# Altium footprint library BOARDS.PcbLib: 27 footprints (part 1 of 2)
Each footprint in its own frame and in the unit in brackets; x right, y up, seen from the top. Pads: shape width x height; smd on the part's side, far side on the other; paste and mask are expansions set on the pad; w line width, h text height; cw(c..) or ccw(c..) is an arc to the next point about the centre after c.
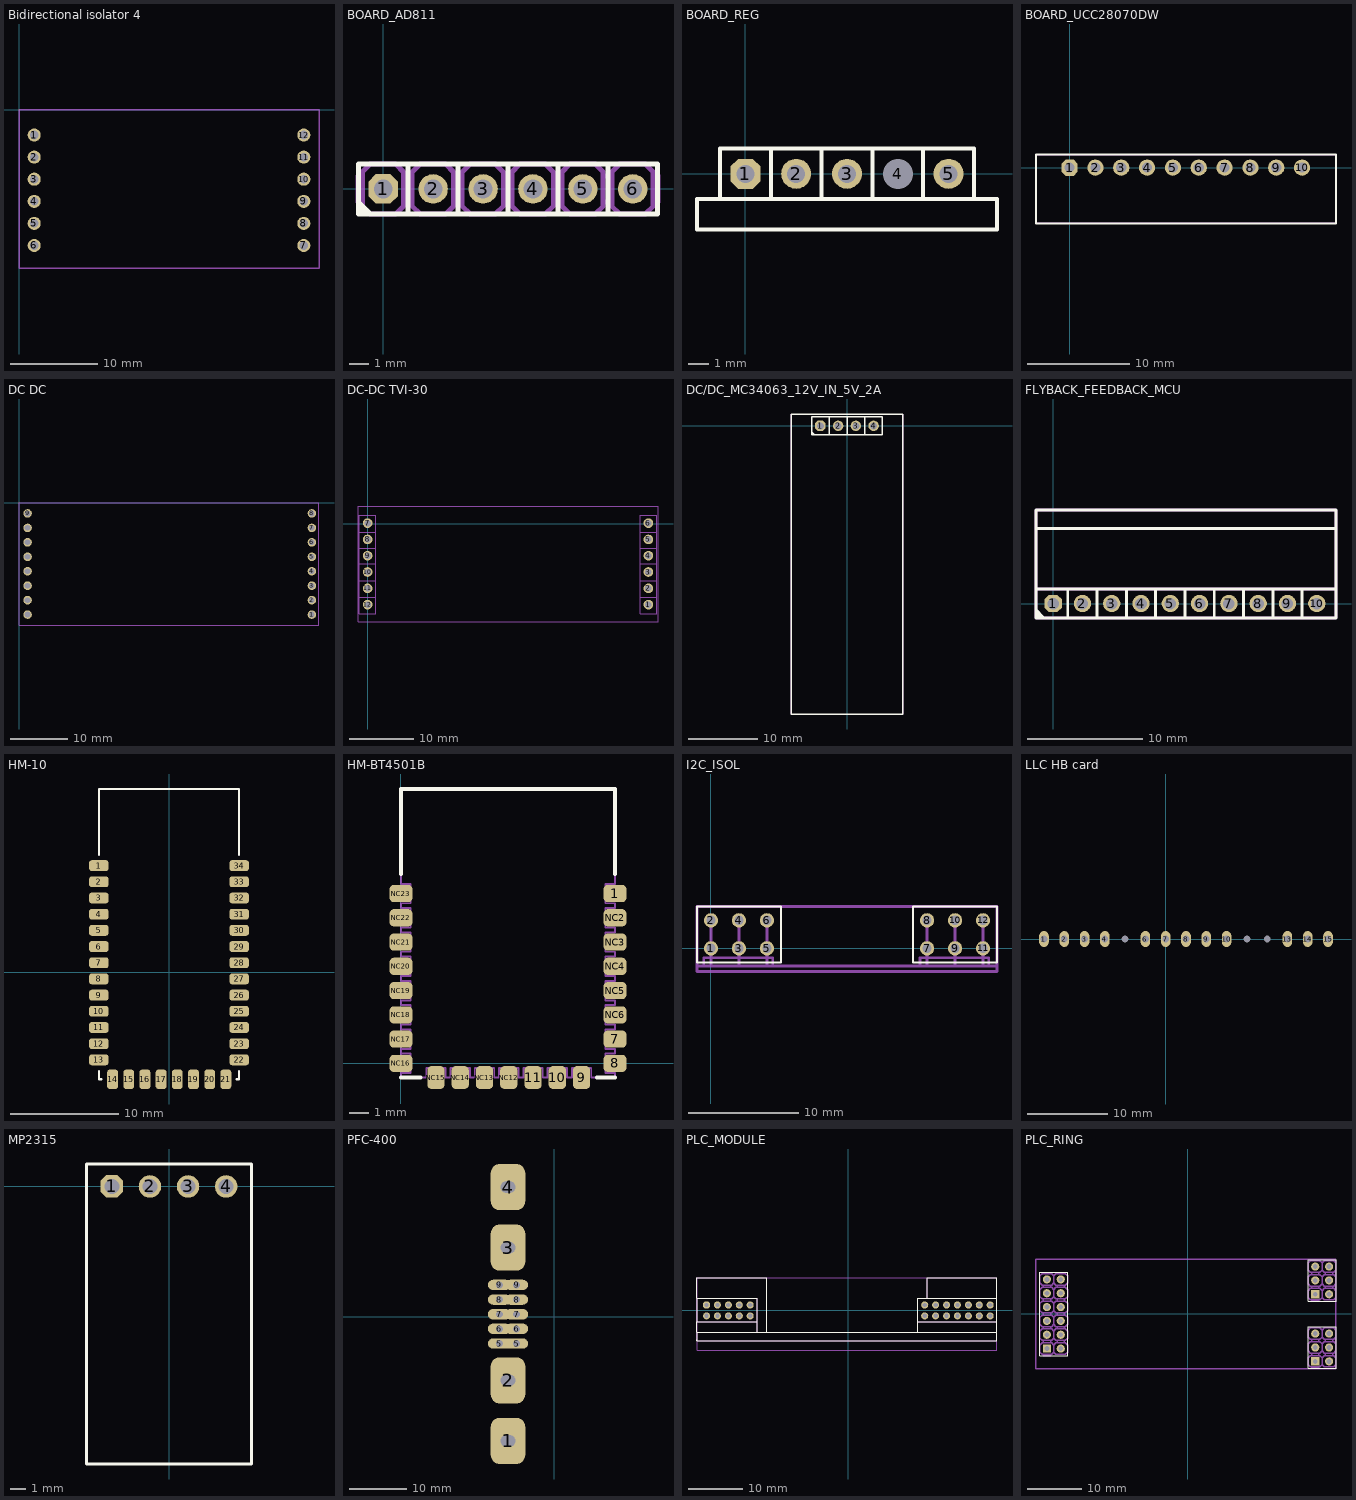
[diagram p0: the footprints below, top view; thin cyan lines are the x and y axes]

## Bidirectional isolator 4 [mm]
pads (12):
  round 1.5 hole 1: 1(1.75,-2.92) 2(1.75,-5.46) 3(1.75,-8) 4(1.75,-10.54) 5(1.75,-13.08) 6(1.75,-15.62) 7(32.75,-15.62) 8(32.75,-13.08) 9(32.75,-10.54) 10(32.75,-8) 11(32.75,-5.46) 12(32.75,-2.92)
Top Assembly:
  lines w0.15: 0,-18.25 34.5,-18.25 34.5,0 0,0 0,-18.25
3D body "PCB1.step": height 8, standoff -3.54, extent 0,-18.5 34.5,-0.25

## BOARD_AD811 [mm] "Плата сопряжения"
pads (6):
  oct 1.5x1.5 hole 0.95: 1(0,0)
  round 1.5 hole 0.95: 2(2.54,0) 3(5.08,0) 4(7.62,0) 5(10.16,0) 6(12.7,0)
Top Overlay:
  region: -1.27,-0.5 -0.5,-1.27 -1.27,-1.27
  lines w0.254: 1.27,-1.25 1.27,1.25 ; 3.81,-1.25 3.81,1.25 ; 6.35,-1.25 6.35,1.25 ; 8.89,-1.25 8.89,1.25 ; 11.43,-1.25 11.43,1.25 ; 13.97,-1.27 -1.27,-1.27 -1.27,1.27 13.97,1.27 ; 13.97,-1.25 13.97,1.25
Top Assembly:
  lines w0.254: -1.064,-0.674 -1.284,-0.674 -1.284,0.666 -1.064,0.666 ; 1.036,-0.674 1.476,-0.674 ; 1.036,0.666 1.476,0.666 ; 3.576,-0.674 4.016,-0.674 ; 3.576,0.666 4.016,0.666 ; 6.116,-0.674 6.556,-0.674 ; 6.116,0.666 6.556,0.666 ; 8.656,-0.674 9.096,-0.674 ; 8.656,0.666 9.096,0.666 ; 11.196,-0.674 11.636,-0.674 ; 11.196,0.666 11.636,0.666 ; 13.764,-0.666 13.984,-0.666 13.984,0.674 13.764,0.674 ; -0.334,-0.324 -0.134,-0.124 ; -0.334,-0.324 -0.334,0.316 ; -0.334,-0.324 0.306,-0.324 ; -0.334,0.316 -0.134,0.116 ; -0.334,0.316 0.306,0.316 ; -0.134,-0.124 -0.134,0.116 ; -0.134,-0.124 0.106,-0.124 ; -0.134,0.116 0.106,0.116 ; 0.106,-0.124 0.106,0.116 ; 0.106,-0.124 0.306,-0.324 ; 0.106,0.116 0.306,0.316 ; 0.306,-0.324 0.306,0.316 ; 2.206,-0.324 2.846,-0.324 ; 2.206,-0.324 2.406,-0.124 ; 2.206,-0.324 2.206,0.316 ; 2.206,0.316 2.846,0.316 ; 2.206,0.316 2.406,0.116 ; 2.406,-0.124 2.406,0.116 ; 2.406,-0.124 2.646,-0.124 ; 2.406,0.116 2.646,0.116 ; 2.646,-0.124 2.646,0.116 ; 2.646,-0.124 2.846,-0.324 ; 2.646,0.116 2.846,0.316 ; 2.846,-0.324 2.846,0.316 ; 4.746,-0.324 4.946,-0.124 ; 4.746,-0.324 4.746,0.316 ; 4.746,-0.324 5.386,-0.324 ; 4.746,0.316 5.386,0.316 ; 4.746,0.316 4.946,0.116 ; 4.946,-0.124 4.946,0.116 ; 4.946,-0.124 5.186,-0.124 ; 4.946,0.116 5.186,0.116 ; 5.186,-0.124 5.186,0.116 ; 5.186,-0.124 5.386,-0.324 ; 5.186,0.116 5.386,0.316 ; 5.386,-0.324 5.386,0.316 ; 7.286,-0.324 7.486,-0.124 ; 7.286,-0.324 7.286,0.316 ; 7.286,-0.324 7.926,-0.324 ; 7.286,0.316 7.486,0.116 ; 7.286,0.316 7.926,0.316 ; 7.486,-0.124 7.486,0.116 ; 7.486,-0.124 7.726,-0.124 ; 7.486,0.116 7.726,0.116 ; 7.726,-0.124 7.726,0.116 ; 7.726,-0.124 7.926,-0.324 ; 7.726,0.116 7.926,0.316 ; 7.926,-0.324 7.926,0.316 ; 9.826,-0.324 10.026,-0.124 ; 9.826,-0.324 9.826,0.316 ; 9.826,-0.324 10.466,-0.324 ; 9.826,0.316 10.026,0.116 ; 9.826,0.316 10.466,0.316 ; 10.026,-0.124 10.026,0.116 ; 10.026,-0.124 10.266,-0.124 ; 10.026,0.116 10.266,0.116 ; 10.266,-0.124 10.466,-0.324 ; 10.266,-0.124 10.266,0.116 ; 10.266,0.116 10.466,0.316 ; 10.466,-0.324 10.466,0.316 ; 12.366,-0.324 13.006,-0.324 ; 12.366,-0.324 12.566,-0.124 ; 12.366,-0.324 12.366,0.316 ; 12.366,0.316 13.006,0.316 ; 12.366,0.316 12.566,0.116 ; 12.566,-0.124 12.806,-0.124 ; 12.566,-0.124 12.566,0.116 ; 12.566,0.116 12.806,0.116 ; 12.806,-0.124 13.006,-0.324 ; 12.806,-0.124 12.806,0.116 ; 12.806,0.116 13.006,0.316 ; 13.006,-0.324 13.006,0.316 ; -1.064,-0.874 -0.664,-1.274 0.636,-1.274 1.036,-0.874 1.036,0.866 0.636,1.266 -0.664,1.266 -1.064,0.866 -1.064,-0.874 ; 1.476,-0.874 1.876,-1.274 3.176,-1.274 3.576,-0.874 3.576,0.866 3.176,1.266 1.876,1.266 1.476,0.866 1.476,-0.874 ; 4.016,-0.874 4.416,-1.274 5.716,-1.274 6.116,-0.874 6.116,0.866 5.716,1.266 4.416,1.266 4.016,0.866 4.016,-0.874 ; 6.556,-0.874 6.956,-1.274 8.256,-1.274 8.656,-0.874 8.656,0.866 8.256,1.266 6.956,1.266 6.556,0.866 6.556,-0.874 ; 9.096,-0.874 9.496,-1.274 10.796,-1.274 11.196,-0.874 11.196,0.866 10.796,1.266 9.496,1.266 9.096,0.866 9.096,-0.874 ; 11.636,-0.874 12.036,-1.274 13.336,-1.274 13.736,-0.874 13.736,0.866 13.336,1.266 12.036,1.266 11.636,0.866 11.636,-0.874
3D body "board_ad811.step": height 31.5, standoff -5.79, extent -1.4,-4.25 14.1,1.4

## BOARD_REG [mm] "Плата регулятора"
height 20
pads (5):
  oct 1.5x1.5 hole 0.9: 1(0,0)
  round 1.5 hole 0.9: 2(2.54,0) 3(5.08,0) 5(10.16,0)
  round 1 hole 1.5: 4(7.62,0)
Top Overlay:
  lines w0.2: -1.27,-1.27 -1.27,1.27 11.43,1.27 11.43,-1.27 ; 1.27,-1.27 1.27,1.27 ; 3.81,-1.27 3.81,1.27 ; 6.35,-1.27 6.35,1.27 ; 8.89,-1.27 8.89,1.27 ; 12.58,-2.794 12.58,-1.27 -2.42,-1.27 -2.42,-2.794 12.58,-2.794
Top Assembly:
  lines w0.15: 1.27,-1.27 1.27,1.27 ; 3.81,-1.27 3.81,1.27 ; 6.35,-1.27 6.35,1.27 ; 8.89,-1.27 8.89,1.27 ; -2.42,-2.794 -2.42,-1.27 12.58,-1.27 12.58,-2.794 -2.42,-2.794 ; -1.27,-1.27 -1.27,1.27 11.43,1.27 11.43,-1.27 -1.27,-1.27
3D body "board_reg.step": height 26.8, standoff -5.74, extent -2.42,-4.572 12.58,3.478

## BOARD_UCC28070DW [mm] "Плата сопряжения"
height 20
pads (10):
  oct 1.6x1.6 hole 1: 1(0,0)
  round 1.6 hole 1: 2(2.54,0) 3(5.08,0) 4(7.62,0) 5(10.16,0) 6(12.7,0) 7(15.24,0) 8(17.78,0) 9(20.32,0) 10(22.86,0)
Top Overlay:
  lines w0.2: -3.302,-5.47 -3.302,1.27 26.198,1.27 26.198,-5.47 -3.302,-5.47
Top Assembly:
  lines w0.15: -3.302,-5.47 26.198,-5.47 26.198,1.27 -3.302,1.27 -3.302,-5.47
3D body "pfc_control_ucc28070.step": height 31.6, standoff -5.69, extent -3.302,-5.47 26.198,1.27

## DC DC [mm]
pads (16):
  round 1.5 hole 1: 1(51.5,-19.705) 2(51.5,-17.165) 3(51.5,-14.625) 4(51.5,-12.085) 5(51.5,-9.545) 6(51.5,-7.005) 7(51.5,-4.465) 8(51.5,-1.925) 9(1.5,-1.925) 10(1.5,-4.465) 11(1.5,-7.005) 12(1.5,-9.545) 13(1.5,-12.085) 14(1.5,-14.625) 15(1.5,-17.165) 16(1.5,-19.705)
Top Assembly:
  lines w0.102: 0,-21.625 26.375,-21.625 52.75,-21.625 52.75,0 0,0 0,-21.625
3D body "DC-DC.step": height 2.5, standoff -18.91, extent 0.113,-21.5 52.887,2

## DC-DC TVI-30 [mm]
pads (12):
  round 1.5 hole 1: 1(43.754,-12.58) 2(43.754,-10.04) 3(43.754,-7.5) 4(43.754,-4.96) 5(43.754,-2.42) 6(43.754,0.12) 7(0,0.12) 8(0,-2.42) 9(0,-4.96) 10(0,-7.5) 11(0,-10.04) 12(0,-12.58)
Top Assembly:
  lines w0.15: -1.274,-11.43 1.266,-11.43 ; -1.274,-1.27 1.266,-1.27 ; -1.27,-8.89 1.27,-8.89 ; -1.27,-6.25 1.27,-6.25 ; -1.27,-3.81 1.27,-3.81 ; 42.48,-11.43 45.02,-11.43 ; 42.48,-1.27 45.02,-1.27 ; 42.484,-8.89 45.024,-8.89 ; 42.484,-6.25 45.024,-6.25 ; 42.484,-3.81 45.024,-3.81 ; -1.5,-15.25 45.25,-15.25 45.25,2.75 -1.5,2.75 -1.5,-15.25 ; -1.274,-14 1.266,-14 1.266,1.376 -1.274,1.376 -1.274,-14 ; 42.48,-14 45.02,-14 45.02,1.376 42.48,1.376 42.48,-14
3D body "DC-DC.step": height 18.8, standoff -0.95, extent -1.5,-15.25 45.25,2.75

## DC/DC_MC34063_12V_IN_5V_2A [mm] "Плата DC/DC"
height 20
pads (4):
  oct 1.5x1.5 hole 1: 1(-3.81,0)
  round 1.5 hole 1: 2(-1.27,0) 3(1.27,0) 4(3.81,0)
Top Overlay:
  region: -5.02,-0.75 -5.08,-0.81 -5.08,-1.27 -4.54,-1.27 -4.52,-1.25
  lines w0.2: -2.54,-1.27 -2.54,1.27 ; 0,-1.27 0,1.27 ; 2.54,-1.27 2.54,1.27 ; -8,-41.3 -8,1.7 8,1.7 8,-41.3 -8,-41.3 ; -5.08,-1.27 5.08,-1.27 5.08,1.27 -5.08,1.27 -5.08,-1.27
Top Assembly:
  lines w0.15: -8,-41.3 -8,1.7 8,1.7 8,-41.3 -8,-41.3
3D body "buck_12_5_2A_board.step": height 13, standoff -6, extent -8,-41.3 8,1.7

## FLYBACK_FEEDBACK_MCU [mm] "Плата сопряжения"
pads (10):
  oct 1.5x1.5 hole 1: 1(0,0)
  round 1.5 hole 1: 2(2.54,0) 3(5.08,0) 4(7.62,0) 5(10.16,0) 6(12.7,0) 7(15.24,0) 8(17.78,0) 9(20.32,0) 10(22.86,0)
Top Overlay:
  region: -1.485,-0.415 -0.715,-1.185 -1.485,-1.185
  lines w0.254: -1.473,1.27 24.527,1.25 ; -1.473,6.5 -1.485,6.512 -1.485,8.128 24.527,8.128 24.527,5.628 ; 1.27,-1.25 1.27,1.25 ; 3.81,-1.25 3.81,1.25 ; 6.35,-1.25 6.35,1.25 ; 8.89,-1.25 8.89,1.25 ; 11.43,-1.25 11.43,1.25 ; 13.97,-1.25 13.97,1.25 ; 16.51,-1.25 16.51,1.25 ; 19.05,-1.25 19.05,1.25 ; 21.59,-1.25 21.59,1.25 ; -1.485,-1.27 -1.485,6.5 24.527,6.5 24.527,-1.27 -1.485,-1.27
Top Assembly:
  lines w0.254: -1.473,1.27 24.384,1.27 ; -1.485,-1.27 -1.485,8.128 24.527,8.128 24.527,-1.27 -1.485,-1.27
3D body "repos_flyback_150_mcu.step": height 28.3, standoff -5.8, extent -1.473,-0.344 24.527,14.987

## HM-10 [mm]
pads (34):
  rrect50% 1.8x1 smd mask+0.1: 1(-6.5,9.9) 2(-6.5,8.4) 3(-6.5,6.9) 4(-6.5,5.4) 5(-6.5,3.9) 6(-6.5,2.4) 7(-6.5,0.9) 8(-6.5,-0.6) 9(-6.5,-2.1) 10(-6.5,-3.6) 11(-6.5,-5.1) 12(-6.5,-6.6) 13(-6.5,-8.1) 22(6.5,-8.1) 23(6.5,-6.6) 24(6.5,-5.1) 25(6.5,-3.6) 26(6.5,-2.1) 27(6.5,-0.6) 28(6.5,0.9) 29(6.5,2.4) 30(6.5,3.9) 31(6.5,5.4) 32(6.5,6.9) 33(6.5,8.4) 34(6.5,9.9)
  rrect50% 1x1.8 smd mask+0.1: 14(-5.23,-9.9) 15(-3.73,-9.9) 16(-2.23,-9.9) 17(-0.73,-9.9) 18(0.77,-9.9) 19(2.27,-9.9) 20(3.77,-9.9) 21(5.27,-9.9)
Top Overlay:
  lines w0.2: -6.5,-9.138 -6.5,-9.9 -6.246,-9.9 ; -6.5,10.9 -6.5,17 6.5,17 6.5,10.9 ; 6.246,-9.9 6.5,-9.9 6.5,-9.138
3D body "HM-10.stp": height 1.61, standoff 0.05, extent -6.5,-9.9 6.5,17

## HM-BT4501B [mm]
pads (23):
  rrect50% 1.2x0.9 smd mask+0.1: 1(11.2,8.89) 7(11.2,1.27) 8(11.2,0) NC2(11.2,7.62) NC3(11.2,6.35) NC4(11.2,5.08) NC5(11.2,3.81) NC6(11.2,2.54) NC16(0,0) NC17(0,1.27) NC18(0,2.54) NC19(0,3.81) NC20(0,5.08) NC21(0,6.35) NC22(0,7.62) NC23(0,8.89)
  rrect50% 0.9x1.2 smd mask+0.1: 9(9.45,-0.74) 10(8.18,-0.74) 11(6.91,-0.74) NC12(5.64,-0.74) NC13(4.37,-0.74) NC14(3.1,-0.74) NC15(1.83,-0.74)
Top Overlay:
  lines w0.2: 0,-0.74 1.016,-0.74 ; 0,9.906 0,14.36 11.2,14.36 11.2,9.906 ; 10.264,-0.74 11.2,-0.74
Board:
  lines w0.1: -0.001,1.779 -0.001,2.031 0.509,2.031 0.509,3.049 -0.001,3.049 -0.001,3.301 0.509,3.301 0.509,4.319 -0.001,4.319 -0.001,4.571 0.509,4.571 0.509,5.589 -0.001,5.589 -0.001,5.841 0.509,5.841 0.509,6.859 -0.001,6.859 -0.001,7.111 0.509,7.111 0.509,8.129 -0.001,8.129 -0.001,8.381 0.509,8.381 0.509,9.399 -0.001,9.399 -0.001,14.359 11.199,14.359 11.2,14.36 11.2,9.399 11.201,9.399 10.691,9.399 10.691,8.381 11.201,8.381 11.201,8.129 10.691,8.129 10.691,7.111 11.201,7.111 11.201,6.859 10.691,6.859 10.691,5.841 11.201,5.841 11.201,5.589 10.691,5.589 10.691,4.571 11.201,4.571 11.201,4.319 10.691,4.319 10.691,3.301 11.201,3.301 11.201,3.049 10.691,3.049 10.691,2.031 11.201,2.031 11.201,1.779 10.691,1.779 10.691,0.761 11.201,0.761 11.201,0.509 10.691,0.509 10.691,-0.509 11.201,-0.509 11.201,-0.74 11.2,-0.74 9.959,-0.74 9.959,-0.232 8.942,-0.232 8.941,-0.231 8.941,-0.741 8.689,-0.741 8.689,-0.231 7.671,-0.231 7.671,-0.741 7.419,-0.741 7.419,-0.231 6.401,-0.231 6.401,-0.741 6.149,-0.741 6.149,-0.231 5.131,-0.231 5.131,-0.741 4.879,-0.741 4.879,-0.231 3.861,-0.231 3.861,-0.741 3.609,-0.741 3.609,-0.231 2.591,-0.231 2.591,-0.741 2.339,-0.741 2.339,-0.231 1.321,-0.231 1.321,-0.741 1.32,-0.74 0.001,-0.74 0.001,-0.509 0.509,-0.509 0.509,0.509 0.001,0.509 0.001,0.761 0.509,0.761 0.509,1.779 ; -0.001,1.779 0,1.778 ; 0,1.778 0.508,1.778 ; 0.508,1.778 0.509,1.779
Top Assembly:
  lines w0.1: 0,-0.508 0.508,-0.508 0.508,0.508 0,0.508 0,0.254 cw(c0,0) 0,-0.254 0,-0.508 ; 0,0.762 0.508,0.762 0.508,1.778 0,1.778 0,1.524 cw(c0,1.27) 0,1.016 0,0.762
3D body: height 0.9, standoff 0, extent -0.001,-0.509 0.509,0.509
3D body: height 0.9, standoff 0, extent -0.001,0.761 0.509,1.779
3D body: height 0.9, standoff 0, extent -0.001,2.031 0.509,3.049
3D body: height 0.9, standoff 0, extent -0.001,3.301 0.509,4.319
3D body: height 0.9, standoff 0, extent -0.001,4.571 0.509,5.589
3D body: height 0.9, standoff 0, extent -0.001,5.841 0.509,6.859
3D body: height 0.9, standoff 0, extent -0.001,7.111 0.509,8.129
3D body: height 0.9, standoff 0, extent -0.001,8.381 0.509,9.399
3D body: height 0.9, standoff 0, extent 1.321,-0.741 2.339,-0.231
3D body: height 0.9, standoff 0, extent 2.591,-0.741 3.609,-0.231
3D body: height 0.9, standoff 0, extent 3.861,-0.741 4.879,-0.231
3D body: height 0.9, standoff 0, extent 5.131,-0.741 6.149,-0.231
3D body: height 0.9, standoff 0, extent 6.401,-0.741 7.419,-0.231
3D body: height 0.9, standoff 0, extent 7.671,-0.741 8.689,-0.231
3D body: height 0.9, standoff 0, extent 8.941,-0.741 9.959,-0.231
3D body: height 0.9, standoff 0, extent 10.691,8.381 11.201,9.399
3D body: height 0.9, standoff 0, extent 10.691,7.111 11.201,8.129
3D body: height 0.9, standoff 0, extent 10.691,5.841 11.201,6.859
3D body: height 0.9, standoff 0, extent 10.691,4.571 11.201,5.589
3D body: height 0.9, standoff 0, extent 10.691,3.301 11.201,4.319
3D body: height 0.9, standoff 0, extent 10.691,2.031 11.201,3.049
3D body: height 0.9, standoff 0, extent 10.691,0.761 11.201,1.779
3D body: height 0.9, standoff 0, extent 10.691,-0.509 11.201,0.509
3D body: height 0.9, standoff 0, extent 0,-0.74 11.2,14.359

## I2C_ISOL [mm]
pads (12):
  round 1.3 hole 0.85: 1(0,0) 2(0,2.54) 3(2.54,0) 4(2.54,2.54) 5(5.08,0) 6(5.08,2.54) 7(19.61,0) 8(19.61,2.54) 9(22.15,0) 10(22.15,2.54) 11(24.69,0) 12(24.69,2.54)
Top Overlay:
  lines w0.2: -1.27,-1.27 6.35,-1.27 6.35,3.81 -1.27,3.81 -1.27,-1.27 ; 18.34,-1.27 25.96,-1.27 25.96,3.81 18.34,3.81 18.34,-1.27
Top Assembly:
  lines w0.25: -1.15,-1.61 25.85,-1.61 ; -0.65,-1.61 -0.65,-0.86 0,-0.86 5.08,-0.86 5.6,-0.86 5.6,-1.61 ; 0,-1.61 0,1.89 ; 2.54,-1.61 2.54,1.89 ; 5.08,-1.61 5.08,1.89 ; 18.96,-1.61 18.96,-0.86 19.61,-0.86 24.69,-0.86 25.21,-0.86 25.21,-1.61 ; 19.61,-1.61 19.61,1.89 ; 22.15,-1.61 22.15,1.89 ; 24.69,-1.61 24.69,1.89 ; -1.27,-2.11 -1.27,3.81 25.96,3.81 25.96,-2.11 -1.27,-2.11
3D body "I2C_ISOL.step": height 20.5, standoff -5.81, extent -1.27,-4.23 25.96,3.85

## LLC HB card [mm]
pads (15):
  oval 1.2x2 hole 0.85: 1(-15.24,0) 2(-12.7,0) 3(-10.16,0) 4(-7.62,0) 6(-2.54,0) 7(0,0) 8(2.54,0) 9(5.08,0) 10(7.62,0) 13(15.24,0) 14(17.78,0) 15(20.32,0)
  round 0 hole 0.85: 5(-5.08,0) 11(10.16,0) 12(12.7,0)
3D body "UCC25630 card.step": height 27, standoff -5.54, extent -16.529,-4.3 21.6,6.075

## MP2315 [mm] "Плата DC/DC"
height 20
pads (4):
  oct 1.5x1.5 hole 1: 1(-3.81,0)
  round 1.5 hole 1: 2(-1.27,0) 3(1.27,0) 4(3.81,0)
Top Overlay:
  lines w0.2: -5.5,-18.5 -5.5,1.5 5.5,1.5 5.5,-18.5 -5.5,-18.5
Top Assembly:
  lines w0.15: -5.5,-18.5 -5.5,1.5 5.5,1.5 5.5,-18.5 -5.5,-18.5
3D body "05KJ_Mini_PCB_Regulator_With_Pin_Assem_.STEP": height 7.19, standoff -5.91, extent -5.5,-18.5 5.5,1.5

## PFC-400 [mm]
pads (14):
  rrect50% 6x8 hole 2 slot 2.5 at 0 deg: 1(-8,-21.5) 2(-8,-11) 3(-8,12) 4(-8,22.5)
  oval 4x1.8 hole 1.2: 5(-9.5,-4.62) 5(-6.5,-4.62) 6(-9.5,-2.08) 6(-6.5,-2.08) 7(-9.5,0.46) 7(-6.5,0.46) 8(-9.5,3) 8(-6.5,3) 9(-9.5,5.54) 9(-6.5,5.54)
Mechanical 2:
  lines w0.15: -10,-5.22 cw(c-10,-4.62) -10.6,-4.62 cw(c-10,-4.62) -10,-4.02 ; -10,-5.22 -9,-5.22 ; -10,-5.22 -9,-5.22 ; -10,-4.02 -9,-4.02 ; -10,-4.02 -9,-4.02 ; -10,-2.68 cw(c-10,-2.08) -10.6,-2.08 cw(c-10,-2.08) -10,-1.48 ; -10,-2.68 -9,-2.68 ; -10,-2.68 -9,-2.68 ; -10,-1.48 -9,-1.48 ; -10,-1.48 -9,-1.48 ; -10,-0.14 cw(c-10,0.46) -10.6,0.46 cw(c-10,0.46) -10,1.06 ; -10,-0.14 -9,-0.14 ; -10,-0.14 -9,-0.14 ; -10,1.06 -9,1.06 ; -10,1.06 -9,1.06 ; -10,2.4 cw(c-10,3) -10.6,3 cw(c-10,3) -10,3.6 ; -10,2.4 -9,2.4 ; -10,2.4 -9,2.4 ; -10,3.6 -9,3.6 ; -10,3.6 -9,3.6 ; -10,4.94 cw(c-10,5.54) -10.6,5.54 cw(c-10,5.54) -10,6.14 ; -10,4.94 -9,4.94 ; -10,4.94 -9,4.94 ; -10,6.14 -9,6.14 ; -10,6.14 -9,6.14 ; -9,-5.22 ccw(c-9,-4.62) -8.4,-4.62 ccw(c-9,-4.62) -9,-4.02 ; -9,-2.68 ccw(c-9,-2.08) -8.4,-2.08 ccw(c-9,-2.08) -9,-1.48 ; -9,-0.14 ccw(c-9,0.46) -8.4,0.46 ccw(c-9,0.46) -9,1.06 ; -9,2.4 ccw(c-9,3) -8.4,3 ccw(c-9,3) -9,3.6 ; -9,4.94 ccw(c-9,5.54) -8.4,5.54 ccw(c-9,5.54) -9,6.14 ; -7,-5.22 cw(c-7,-4.62) -7.6,-4.62 cw(c-7,-4.62) -7,-4.02 ; -7,-5.22 -6,-5.22 ; -7,-5.22 -6,-5.22 ; -7,-4.02 -6,-4.02 ; -7,-4.02 -6,-4.02 ; -7,-2.68 cw(c-7,-2.08) -7.6,-2.08 cw(c-7,-2.08) -7,-1.48 ; -7,-2.68 -6,-2.68 ; -7,-2.68 -6,-2.68 ; -7,-1.48 -6,-1.48 ; -7,-1.48 -6,-1.48 ; -7,-0.14 cw(c-7,0.46) -7.6,0.46 cw(c-7,0.46) -7,1.06 ; -7,-0.14 -6,-0.14 ; -7,-0.14 -6,-0.14 ; -7,1.06 -6,1.06 ; -7,1.06 -6,1.06 ; -7,2.4 cw(c-7,3) -7.6,3 cw(c-7,3) -7,3.6 ; -7,2.4 -6,2.4 ; -7,2.4 -6,2.4 ; -7,3.6 -6,3.6 ; -7,3.6 -6,3.6 ; -7,4.94 cw(c-7,5.54) -7.6,5.54 cw(c-7,5.54) -7,6.14 ; -7,4.94 -6,4.94 ; -7,4.94 -6,4.94 ; -7,6.14 -6,6.14 ; -7,6.14 -6,6.14 ; -6,-5.22 ccw(c-6,-4.62) -5.4,-4.62 ccw(c-6,-4.62) -6,-4.02 ; -6,-2.68 ccw(c-6,-2.08) -5.4,-2.08 ccw(c-6,-2.08) -6,-1.48 ; -6,-0.14 ccw(c-6,0.46) -5.4,0.46 ccw(c-6,0.46) -6,1.06 ; -6,2.4 ccw(c-6,3) -5.4,3 ccw(c-6,3) -6,3.6 ; -6,4.94 ccw(c-6,5.54) -5.4,5.54 ccw(c-6,5.54) -6,6.14 ; -9.5,-24.75 ccw(c-9,-24.75) -9,-25.25 -7,-25.25 ccw(c-7,-24.75) -6.5,-24.75 -6.5,-21.5 -6.5,-18.25 ccw(c-7,-18.25) -7,-17.75 -9,-17.75 ccw(c-9,-18.25) -9.5,-18.25 -9.5,-21.5 -9.5,-24.75 ; -9.5,-14.25 ccw(c-9,-14.25) -9,-14.75 -7,-14.75 ccw(c-7,-14.25) -6.5,-14.25 -6.5,-11 -6.5,-7.75 ccw(c-7,-7.75) -7,-7.25 -9,-7.25 ccw(c-9,-7.75) -9.5,-7.75 -9.5,-11 -9.5,-14.25 ; -9.5,8.75 ccw(c-9,8.75) -9,8.25 -7,8.25 ccw(c-7,8.75) -6.5,8.75 -6.5,12 -6.5,15.25 ccw(c-7,15.25) -7,15.75 -9,15.75 ccw(c-9,15.25) -9.5,15.25 -9.5,12 -9.5,8.75 ; -9.5,19.25 ccw(c-9,19.25) -9,18.75 -7,18.75 ccw(c-7,19.25) -6.5,19.25 -6.5,22.5 -6.5,25.75 ccw(c-7,25.75) -7,26.25 -9,26.25 ccw(c-9,25.75) -9.5,25.75 -9.5,22.5 -9.5,19.25
3D body "Main.step": height 40, standoff -6.04, extent -11,-24.54 11.911,25.46

## PLC_MODULE [mm] "Плата сопряжения"
height 20
pads (24):
  oct 1.3x1.3 hole 0.8: 1(-26,1)
  round 1.3 hole 0.8: 2(-26,-1) 3(-24,1) 4(-24,-1) 5(-22,1) 6(-22,-1) 7(-20,1) 8(-20,-1) 9(-18,1) 10(-18,-1) 11(14,1) 12(14,-1) 13(16,1) 14(16,-1) 15(18,1) 16(18,-1) 17(20,1) 18(20,-1) 19(22,1) 20(22,-1) 21(24,1) 22(24,-1) 23(26,1) 24(26,-1)
Top Overlay:
  lines w0.2: -27.27,-4.031 -27.75,-4.031 ; -16.73,-4.031 -16.73,-2.048 ; -14.952,-4.031 -14.952,5.969 -27.75,5.969 -27.75,2.27 ; 12.73,-2.048 27.25,-2.048 ; 14.452,2.27 14.452,5.969 27.25,5.969 27.25,-5.604 ; 16.23,-4.031 12.73,-4.031 12.73,2.27 27.25,2.27 ; 26.77,-4.031 27.25,-4.031 ; -27.75,-5.604 -27.75,-5.35 ; -27.75,-5.604 27.25,-5.604 ; -27.75,-5.604 27.25,-5.604 ; -27.75,-5.604 -27.75,-5.604 ; -27.75,-5.35 -27.75,-5.35 ; -27.75,-5.35 -27.75,-4.031 ; -27.75,-4.031 -27.75,-4.031 ; -27.75,-4.031 -27.75,-4.031 ; -27.75,-4.031 27.25,-4.031 ; -27.75,-4.031 -27.75,-2.048 ; -27.75,-2.048 -16.73,-2.048 ; -27.75,-2.048 -27.75,2.27 ; -27.75,2.27 -16.73,2.27 -16.73,-2.048 ; 27.25,-4.031 27.25,-4.031 ; 27.25,-4.031 27.25,-4.031
Top Assembly:
  lines w0.15: -14.952,-4.031 -14.952,5.969 -27.75,5.969 ; 12.73,-2.048 27.25,-2.048 ; 27.25,2.27 12.73,2.27 ; -27.75,-5.604 -27.75,-2.048 ; -27.75,-5.604 -27.75,-5.604 ; -27.75,-5.604 -27.75,-5.604 ; -27.75,-5.604 -27.75,-4.031 27.25,-4.031 ; -27.75,-5.604 27.25,-5.604 27.25,-4.031 ; -27.75,-2.048 -27.75,5.969 ; -27.75,-2.048 -27.75,-2.048 ; -27.75,-2.048 -27.75,2.27 -16.73,2.27 -16.73,-4.031 -16.73,-2.048 ; -27.75,-2.048 -16.73,-2.048 ; -27.75,5.969 -27.75,5.969 ; -27.75,5.969 -27.75,5.969 ; -27.75,5.969 27.25,5.969 ; -27.75,5.969 -27.75,-7.281 27.25,-7.281 27.25,5.969 ; -16.73,-2.048 -16.73,-2.048 ; 12.73,2.27 12.73,-4.031 27.25,-4.031 ; 12.73,2.27 14.452,2.27 14.452,5.969 27.25,5.969 ; 27.25,-4.031 27.25,5.969 ; 27.25,-4.031 27.25,-4.031
3D body "PLC_Module.step": height 20.05, standoff -3.7, extent -27.75,-7.281 27.25,5.969

## PLC_RING [mm]
pads (24):
  rect 1.5x1.5 hole 0.9: X1_1(23.33,3.61) X2_1(-25.87,-6.36) X3_1(23.33,-8.69)
  round 1.5 hole 0.9: X1_2(25.87,3.61) X1_3(23.33,6.15) X1_4(25.87,6.15) X1_5(23.33,8.69) X1_6(25.87,8.69) X2_2(-23.33,-6.36) X2_3(-25.87,-3.82) X2_4(-23.33,-3.82) X2_5(-25.87,-1.28) X2_6(-23.33,-1.28) X2_7(-25.87,1.26) X2_8(-23.33,1.26) X2_9(-25.87,3.8) X2_10(-23.33,3.8) X2_11(-25.87,6.34) X2_12(-23.33,6.34) X3_2(25.87,-8.69) X3_3(23.33,-6.15) X3_4(25.87,-6.15) X3_5(23.33,-3.61) X3_6(25.87,-3.61)
Top Overlay:
  lines w0.2: 22.06,-5.092 22.06,-9.96 ; 22.06,7.208 22.06,2.34 ; 22.06,-9.96 27.14,-9.96 27.14,-2.34 22.06,-2.34 22.06,-9.96 ; 22.06,2.34 27.14,2.34 27.14,9.96 22.06,9.96 22.06,2.34 ; -27.14,-7.63 -22.06,-7.63 -22.06,7.61 -27.14,7.61 -27.14,-7.63
Top Assembly:
  drawing of 517 lines, arcs and shapes, not listed
3D body "PLC_ModuleV0.0.1.step": height 14.87, standoff -3.39, extent -27.9,-10 27.12,10